# Altium footprint library domino-spring-clamp.PcbLib: 258 footprints (part 15 of 17)
Each footprint in its own frame and in the unit in brackets; x right, y up, seen from the top. Pads: shape width x height; smd on the part's side, far side on the other; paste and mask are expansions set on the pad; w line width, h text height; cw(c..) or ccw(c..) is an arc to the next point about the centre after c.
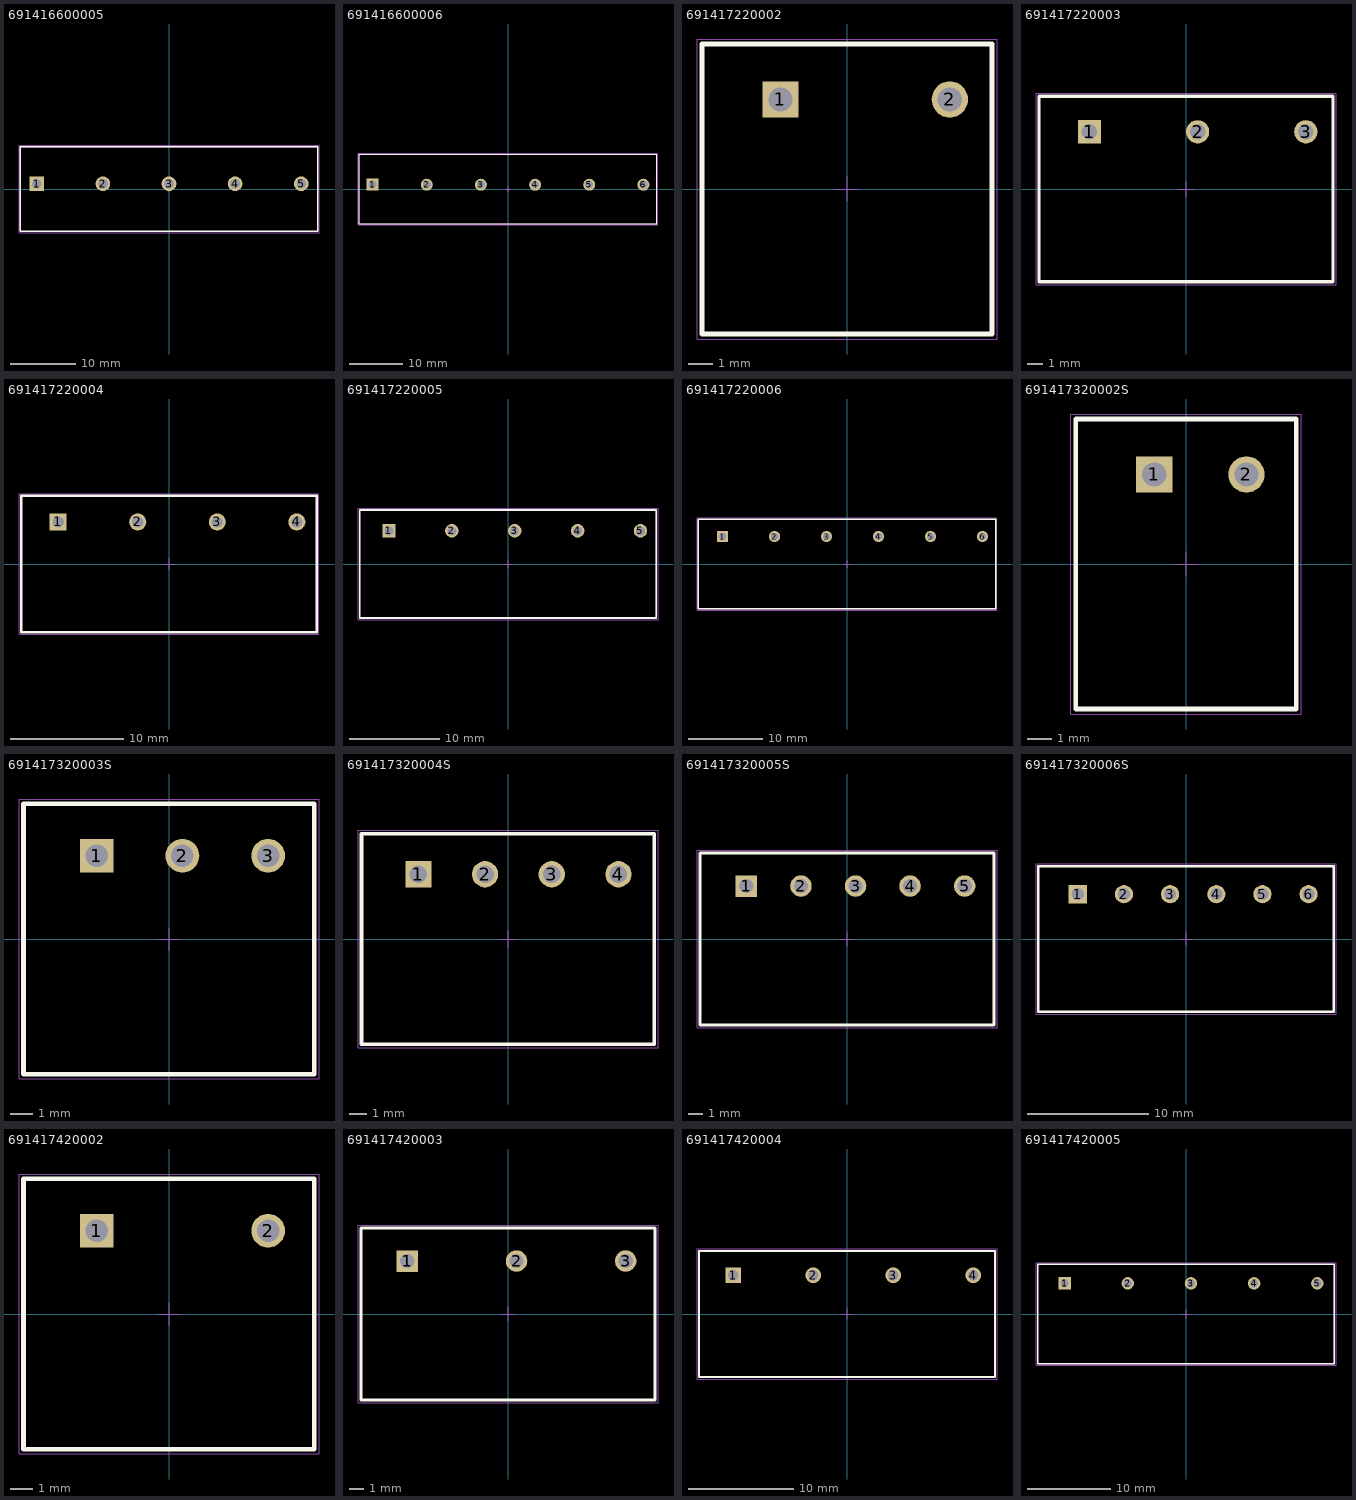
[diagram p14: the footprints below, top view; thin cyan lines are the x and y axes]

## 691416600005 [mm] "Serie 4166 - 10.16 mm _ 5 pins"
height 12.5
pads (5):
  rect 2.25x2.25 hole 1.5: 1(-20.32,0.8)
  round 2.25 hole 1.5: 2(-10.16,0.8) 3(0,0.8) 4(10.16,0.8) 5(20.32,0.8)
Top Overlay:
  lines w0.2: -22.86,-6.5 22.86,-6.5 22.86,6.5 -22.86,6.5 -22.86,-6.5
Mechanical 13:
  lines w0.1: -22.86,-6.5 -22.86,6.5 22.86,6.5 22.86,-6.5 -22.86,-6.5
Mechanical 15:
  lines w0.05: -0.5,0 0.5,0 ; 0,-0.5 0,0.5 ; -23.06,-6.7 23.06,-6.7 23.06,6.7 -23.06,6.7 -23.06,-6.7
3D body "691416600005.stp": height 12.55, standoff -4.95, extent -22.86,-6.5 22.86,6.5

## 691416600006 [mm] "Serie 4166 - 10.16 mm _ 6 pins"
height 12.5
pads (6):
  rect 2.25x2.25 hole 1.5: 1(-25.4,0.8)
  round 2.25 hole 1.5: 2(-15.24,0.8) 3(-5.08,0.8) 4(5.08,0.8) 5(15.24,0.8) 6(25.4,0.8)
Top Overlay:
  lines w0.2: -27.94,-6.5 -27.94,6.5 27.94,6.5 27.94,-6.5 -27.94,-6.5
Mechanical 13:
  lines w0.1: -27.94,-6.5 27.94,-6.5 27.94,6.5 -27.94,6.5 -27.94,-6.5
Mechanical 15:
  lines w0.05: -0.5,0 0.5,0 ; 0,-0.5 0,0.5 ; -28.14,-6.7 -28.14,6.7 28.14,6.7 28.14,-6.7 -28.14,-6.7
3D body "691416600006.stp": height 12.55, standoff -4.95, extent -27.94,-6.5 27.94,6.5

## 691417220002 [mm] "Serie 4172-7.00mm 45deg Cable Entry Screwless, 2 pins"
height 13.2
pads (2):
  rect 1.5x1.5 hole 1: 1(-2.75,3.7)
  round 1.5 hole 1: 2(4.25,3.7)
Top Overlay:
  lines w0.2: -6,-6 -6,6 6,6 6,-6 -6,-6
Mechanical 13:
  lines w0.1: -6,-6 6,-6 6,6 -6,6 -6,-6
Mechanical 15:
  lines w0.05: -0.5,0 0.5,0 ; 0,-0.5 0,0.5 ; -6.2,-6.2 6.2,-6.2 6.2,6.2 -6.2,6.2 -6.2,-6.2
3D body "691417220002.stp": height 13.23, standoff -3.57, extent -6,-6 6.001,6

## 691417220003 [mm] "Serie 4172-7.00mm 45deg Cable Entry Screwless, 3 pins"
height 13.2
pads (3):
  rect 1.5x1.5 hole 1: 1(-6.25,3.7)
  round 1.5 hole 1: 2(0.75,3.7) 3(7.75,3.7)
Top Overlay:
  lines w0.2: -9.5,-6 9.5,-6 9.5,6 -9.5,6 -9.5,-6
Mechanical 13:
  lines w0.1: -9.5,-6 -9.5,6 9.5,6 9.5,-6 -9.5,-6
Mechanical 15:
  lines w0.05: -0.5,0 0.5,0 ; 0,-0.5 0,0.5 ; -9.7,-6.2 -9.7,6.2 9.7,6.2 9.7,-6.2 -9.7,-6.2
3D body "691417220003.stp": height 13.23, standoff -3.57, extent -9.5,-6 9.501,6

## 691417220004 [mm] "Serie 4172-7.00mm 45deg Cable Entry Screwless, 4 pins"
height 13.2
pads (4):
  rect 1.5x1.5 hole 1: 1(-9.75,3.7)
  round 1.5 hole 1: 2(-2.75,3.7) 3(4.25,3.7) 4(11.25,3.7)
Top Overlay:
  lines w0.2: -13,-6 13,-6 13,6 -13,6 -13,-6
Mechanical 13:
  lines w0.1: -13,-6 -13,6 13,6 13,-6 -13,-6
Mechanical 15:
  lines w0.05: -0.5,0 0.5,0 ; 0,-0.5 0,0.5 ; -13.2,-6.2 -13.2,6.2 13.2,6.2 13.2,-6.2 -13.2,-6.2
3D body "691417220004.stp": height 13.23, standoff -3.57, extent -13,-6 13.001,6

## 691417220005 [mm] "Serie 4172-7.00mm 45deg Cable Entry Screwless, 5 pins"
height 13.2
pads (5):
  rect 1.5x1.5 hole 1: 1(-13.25,3.7)
  round 1.5 hole 1: 2(-6.25,3.7) 3(0.75,3.7) 4(7.75,3.7) 5(14.75,3.7)
Top Overlay:
  lines w0.2: -16.5,-6 -16.5,6 16.5,6 16.5,-6 -16.5,-6
Mechanical 13:
  lines w0.1: -16.5,-6 16.5,-6 16.5,6 -16.5,6 -16.5,-6
Mechanical 15:
  lines w0.05: -0.5,0 0.5,0 ; 0,-0.5 0,0.5 ; -16.7,-6.2 16.7,-6.2 16.7,6.2 -16.7,6.2 -16.7,-6.2
3D body "691417220005.stp": height 13.23, standoff -3.57, extent -16.5,-6 16.501,6

## 691417220006 [mm] "Serie 4172-7.00mm 45deg Cable Entry Screwless, 6 pins"
height 13.2
pads (6):
  rect 1.5x1.5 hole 1: 1(-16.75,3.7)
  round 1.5 hole 1: 2(-9.75,3.7) 3(-2.75,3.7) 4(4.25,3.7) 5(11.25,3.7) 6(18.25,3.7)
Top Overlay:
  lines w0.2: -20,-6 20,-6 20,6 -20,6 -20,-6
Mechanical 13:
  lines w0.1: -20,-6 -20,6 20,6 20,-6 -20,-6
Mechanical 15:
  lines w0.05: -0.5,0 0.5,0 ; 0,-0.5 0,0.5 ; -20.2,-6.2 -20.2,6.2 20.2,6.2 20.2,-6.2 -20.2,-6.2
3D body "691417220006.stp": height 13.23, standoff -3.57, extent -20,-6 20.001,6

## 691417320002S [mm] "Serie 4713S-3.81mm 45¡ã Cable Entry Screwless, 2 pins"
height 13.2
pads (2):
  rect 1.5x1.5 hole 1: 1(-1.31,3.7)
  round 1.5 hole 1: 2(2.5,3.7)
Top Overlay:
  lines w0.2: -4.56,-6 4.56,-6 4.56,6 -4.56,6 -4.56,-6
Mechanical 13:
  lines w0.1: -4.56,-6 -4.56,6 4.56,6 4.56,-6 -4.56,-6
Mechanical 15:
  lines w0.05: -0.5,0 0.5,0 ; 0,-0.5 0,0.5 ; -4.76,-6.2 -4.76,6.2 4.76,6.2 4.76,-6.2 -4.76,-6.2
3D body "691417320002S.stp": height 13.28, standoff -3.52, extent -4.56,-6 4.544,6

## 691417320003S [mm] "Serie 4713S-3.81mm 45¡ã Cable Entry Screwless, 3 pins"
height 13.2
pads (3):
  rect 1.5x1.5 hole 1: 1(-3.215,3.7)
  round 1.5 hole 1: 2(0.595,3.7) 3(4.405,3.7)
Top Overlay:
  lines w0.2: -6.465,-6 -6.465,6 6.465,6 6.465,-6 -6.465,-6
Mechanical 13:
  lines w0.1: -6.465,-6 6.465,-6 6.465,6 -6.465,6 -6.465,-6
Mechanical 15:
  lines w0.05: -0.5,0 0.5,0 ; 0,-0.5 0,0.5 ; -6.665,-6.2 6.665,-6.2 6.665,6.2 -6.665,6.2 -6.665,-6.2
3D body "691417320003S.stp": height 13.28, standoff -3.52, extent -6.465,-6 6.442,6

## 691417320004S [mm] "Serie 4713S-3.81mm 45¡ã Cable Entry Screwless, 4 pins"
height 13.2
pads (4):
  rect 1.5x1.5 hole 1: 1(-5.12,3.7)
  round 1.5 hole 1: 2(-1.31,3.7) 3(2.5,3.7) 4(6.31,3.7)
Top Overlay:
  lines w0.2: -8.37,-6 -8.37,6 8.37,6 8.37,-6 -8.37,-6
Mechanical 13:
  lines w0.1: -8.37,-6 8.37,-6 8.37,6 -8.37,6 -8.37,-6
Mechanical 15:
  lines w0.05: -0.5,0 0.5,0 ; 0,-0.5 0,0.5 ; -8.57,-6.2 8.57,-6.2 8.57,6.2 -8.57,6.2 -8.57,-6.2
3D body "691417320004S.stp": height 13.28, standoff -3.52, extent -8.37,-6 8.341,6

## 691417320005S [mm] "Serie 4713S-3.81mm 45¡ã Cable Entry Screwless, 5 pins"
height 13.2
pads (5):
  rect 1.5x1.5 hole 1: 1(-7.025,3.7)
  round 1.5 hole 1: 2(-3.215,3.7) 3(0.595,3.7) 4(4.405,3.7) 5(8.215,3.7)
Top Overlay:
  lines w0.2: -10.275,-6 -10.275,6 10.275,6 10.275,-6 -10.275,-6
Mechanical 13:
  lines w0.1: -10.275,-6 10.275,-6 10.275,6 -10.275,6 -10.275,-6
Mechanical 15:
  lines w0.05: -0.5,0 0.5,0 ; 0,-0.5 0,0.5 ; -10.475,-6.2 10.475,-6.2 10.475,6.2 -10.475,6.2 -10.475,-6.2
3D body "691417320005S.stp": height 13.28, standoff -3.52, extent -10.275,-6 10.239,6

## 691417320006S [mm] "Serie 4713S-3.81mm 45¡ã Cable Entry Screwless, 6 pins"
height 13.2
pads (6):
  rect 1.5x1.5 hole 1: 1(-8.93,3.7)
  round 1.5 hole 1: 2(-5.12,3.7) 3(-1.31,3.7) 4(2.5,3.7) 5(6.31,3.7) 6(10.12,3.7)
Top Overlay:
  lines w0.2: -12.18,-6 -12.18,6 12.18,6 12.18,-6 -12.18,-6
Mechanical 13:
  lines w0.1: -12.18,-6 12.18,-6 12.18,6 -12.18,6 -12.18,-6
Mechanical 15:
  lines w0.05: -0.5,0 0.5,0 ; 0,-0.5 0,0.5 ; -12.38,-6.2 12.38,-6.2 12.38,6.2 -12.38,6.2 -12.38,-6.2
3D body "691417320006S.stp": height 13.28, standoff -3.52, extent -12.18,-6 12.187,6

## 691417420002 [mm] "7.62 mm 45deg Entry Screwless, 2p"
height 13.2
pads (2):
  rect 1.5x1.5 hole 1: 1(-3.215,3.7)
  round 1.5 hole 1: 2(4.405,3.7)
Top Overlay:
  lines w0.2: -6.465,-6 -6.465,6 6.465,6 6.465,-6 -6.465,-6
Mechanical 13:
  lines w0.1: -6.465,-6 6.465,-6 6.465,6 -6.465,6 -6.465,-6
Mechanical 15:
  lines w0.05: -0.5,0 0.5,0 ; 0,-0.5 0,0.5 ; -6.665,-6.2 -6.665,6.2 6.665,6.2 6.665,-6.2 -6.665,-6.2
3D body "691417420002.stp": height 13.28, standoff -3.52, extent -6.465,-6 6.466,6

## 691417420003 [mm] "7.62 mm 45deg Entry Screwless, 3p"
height 13.2
pads (3):
  rect 1.5x1.5 hole 1: 1(-7.025,3.7)
  round 1.5 hole 1: 2(0.595,3.7) 3(8.215,3.7)
Top Overlay:
  lines w0.2: -10.275,-6 10.275,-6 10.275,6 -10.275,6 -10.275,-6
Mechanical 13:
  lines w0.1: -10.275,-6 -10.275,6 10.275,6 10.275,-6 -10.275,-6
Mechanical 15:
  lines w0.05: -0.5,0 0.5,0 ; 0,-0.5 0,0.5 ; -10.475,-6.2 10.475,-6.2 10.475,6.2 -10.475,6.2 -10.475,-6.2
3D body "691417420003.stp": height 13.28, standoff -3.52, extent -10.275,-6 10.276,6

## 691417420004 [mm] "7.62 mm 45deg Entry Screwless, 4p"
height 13.2
pads (4):
  rect 1.5x1.5 hole 1: 1(-10.835,3.7)
  round 1.5 hole 1: 2(-3.215,3.7) 3(4.405,3.7) 4(12.025,3.7)
Top Overlay:
  lines w0.2: -14.085,-6 -14.085,6 14.085,6 14.085,-6 -14.085,-6
Mechanical 13:
  lines w0.1: -14.085,-6 14.085,-6 14.085,6 -14.085,6 -14.085,-6
Mechanical 15:
  lines w0.05: -0.5,0 0.5,0 ; 0,-0.5 0,0.5 ; -14.285,-6.2 -14.285,6.2 14.285,6.2 14.285,-6.2 -14.285,-6.2
3D body "691417420004.stp": height 13.28, standoff -3.52, extent -14.085,-6 14.086,6

## 691417420005 [mm] "7.62 mm 45deg Entry Screwless, 5p"
height 13.2
pads (5):
  rect 1.5x1.5 hole 1: 1(-14.645,3.7)
  round 1.5 hole 1: 2(-7.025,3.7) 3(0.595,3.7) 4(8.215,3.7) 5(15.835,3.7)
Top Overlay:
  lines w0.2: -17.895,-6 17.895,-6 17.895,6 -17.895,6 -17.895,-6
Mechanical 13:
  lines w0.1: -17.895,-6 -17.895,6 17.895,6 17.895,-6 -17.895,-6
Mechanical 15:
  lines w0.05: -0.5,0 0.5,0 ; 0,-0.5 0,0.5 ; -18.095,-6.2 18.095,-6.2 18.095,6.2 -18.095,6.2 -18.095,-6.2
3D body "691417420005.stp": height 13.28, standoff -3.52, extent -17.895,-6 17.896,6